# Altium footprint library EDR.PcbLib: 85 footprints (part 6 of 6)
Each footprint in its own frame and in the unit in brackets; x right, y up, seen from the top. Pads: shape width x height; smd on the part's side, far side on the other; paste and mask are expansions set on the pad; w line width, h text height; cw(c..) or ccw(c..) is an arc to the next point about the centre after c.
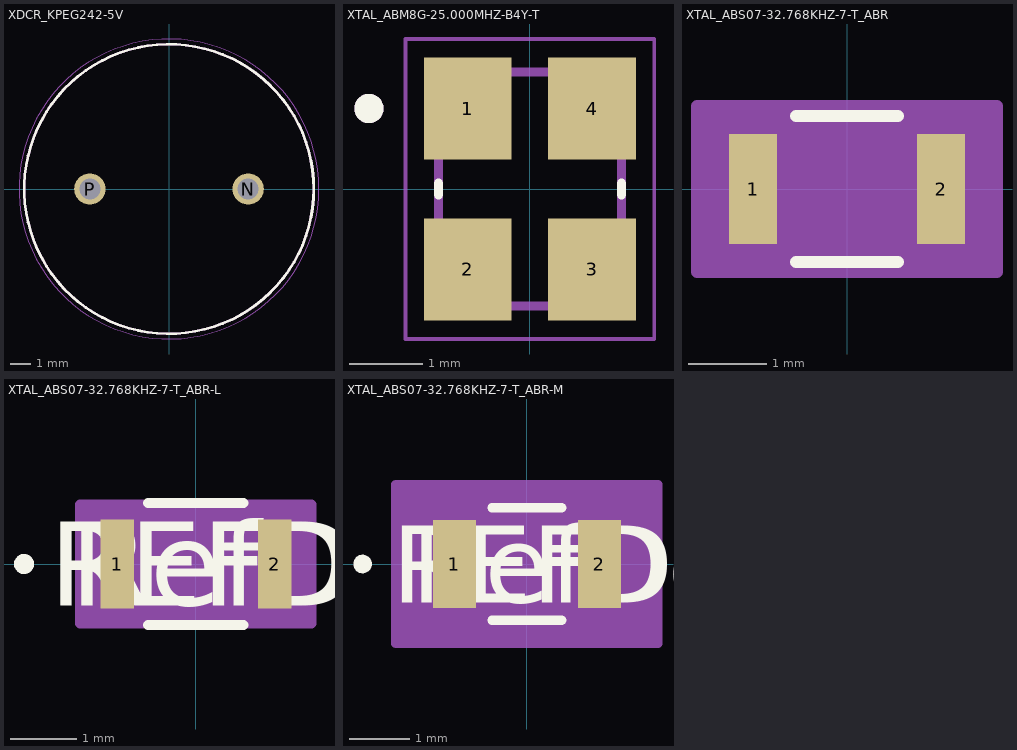
[diagram p5: the footprints below, top view; thin cyan lines are the x and y axes]

## XDCR_KPEG242-5V [mm]
pads (2):
  round 1.508 hole 1: N(3.8,0) P(-3.8,0)
Top Overlay:
  circle w0.127: c0,0 r6.95
Top 3D Body:
  circle w0.127: c0,0 r6.95
Top Courtyard:
  circle w0.05: c0,0 r7.2
3D body "KPEG242-5V--3DModel-STEP-532303.STEP": height 7.5, standoff -5.6, extent -7.026,-6.938 6.874,6.938

## XTAL_ABM8G-25.000MHZ-B4Y-T [mm]
height 1
pads (4):
  rect 1.2x1.4 smd: 1(-0.85,1.1) 2(-0.85,-1.1) 3(0.85,-1.1) 4(0.85,1.1)
Top Overlay:
  circle w0.2: c-2.2,1.1 r0.1
  lines w0.127: -1.25,-0.08 -1.25,0.08 ; 1.25,-0.08 1.25,0.08
Top 3D Body:
  circle w0.2: c-2.2,1.1 r0.1
  lines w0.127: -1.25,-1.6 1.25,-1.6 1.25,1.6 -1.25,1.6 -1.25,-1.6
Top Courtyard:
  lines w0.05: -1.7,-2.05 1.7,-2.05 1.7,2.05 -1.7,2.05 -1.7,-2.05
3D body "step_temp.STEP": height 0.99, standoff 0, extent -1.6,-1.245 1.6,1.245

## XTAL_ABS07-32.768KHZ-7-T_ABR [mil]
pads (2):
  rect 24x55 smd paste+0 mask+0: 1(-47,0) 2(47,0)
Top Overlay:
  lines w6: -25.48,-36.5 25.48,-36.5 ; -25.48,36.5 25.48,36.5
Top 3D Body:
  lines w1: -65,-31.5 -65,31.5 65,31.5 65,-31.5 -65,-31.5
Top Courtyard:
  region: -75,-37.5 -75,37.5 -75,41.5 75,41.5 75,37.5 75,-37.5 75,-41.5 -75,-41.5
  lines w6: -75,-41.5 75,-41.5 75,-37.5 75,37.5 75,41.5 -75,41.5 -75,37.5 -75,-37.5 -75,-41.5
3D body "XTAL_ABS07-32768KHZ-7-T_ABR.step": height 32.09, standoff 0, extent -65,-31.5 65,31.5

## XTAL_ABS07-32.768KHZ-7-T_ABR-L [mil]
pads (2):
  rect 20x53 smd paste+0 mask+0: 1(-47,0) 2(47,0)
Top Overlay:
  circle w6: c-102.5,0 r3
  lines w6: -28.54,-36.5 28.54,-36.5 ; -28.54,36.5 28.54,36.5
  text "RefDes" at -75,-25 h50
  text "REFDES" at -87.5,-25 h50
Top 3D Body:
  circle w0: c0,0 r3
  lines w1: -65,-31.5 -65,31.5 65,31.5 65,-31.5 -65,-31.5
  text "RefDes2" at -87.5,-25 h50
Top Courtyard:
  region: -69,-30.5 -69,30.5 -69,35.5 69,35.5 69,30.5 69,-30.5 69,-35.5 -69,-35.5
  lines w6: -69,-35.5 69,-35.5 69,-30.5 69,30.5 69,35.5 -69,35.5 -69,30.5 -69,-30.5 -69,-35.5
3D body: height 10, standoff 0, extent 0,0 10,10

## XTAL_ABS07-32.768KHZ-7-T_ABR-M [mil]
pads (2):
  rect 28x57 smd paste+0 mask+0: 1(-47,0) 2(47,0)
Top Overlay:
  circle w6: c-106.5,0 r3
  lines w6: -22.63,-36.5 22.63,-36.5 ; -22.63,36.5 22.63,36.5
  text "RefDes" at -75,-25 h50
  text "REFDES" at -87.5,-25 h50
Top 3D Body:
  circle w0: c0,0 r3
  lines w1: -65,-31.5 -65,31.5 65,31.5 65,-31.5 -65,-31.5
  text "RefDes2" at -87.5,-25 h50
Top Courtyard:
  region: -85,-48.5 -85,48.5 -85,51.5 85,51.5 85,48.5 85,-48.5 85,-51.5 -85,-51.5
  lines w6: -85,-51.5 85,-51.5 85,-48.5 85,48.5 85,51.5 -85,51.5 -85,48.5 -85,-48.5 -85,-51.5
3D body: height 10, standoff 0, extent 0,0 10,10